# Altium footprint library Connectors.PcbLib: 97 footprints (part 4 of 7)
Each footprint in its own frame and in the unit in brackets; x right, y up, seen from the top. Pads: shape width x height; smd on the part's side, far side on the other; paste and mask are expansions set on the pad; w line width, h text height; cw(c..) or ccw(c..) is an arc to the next point about the centre after c.
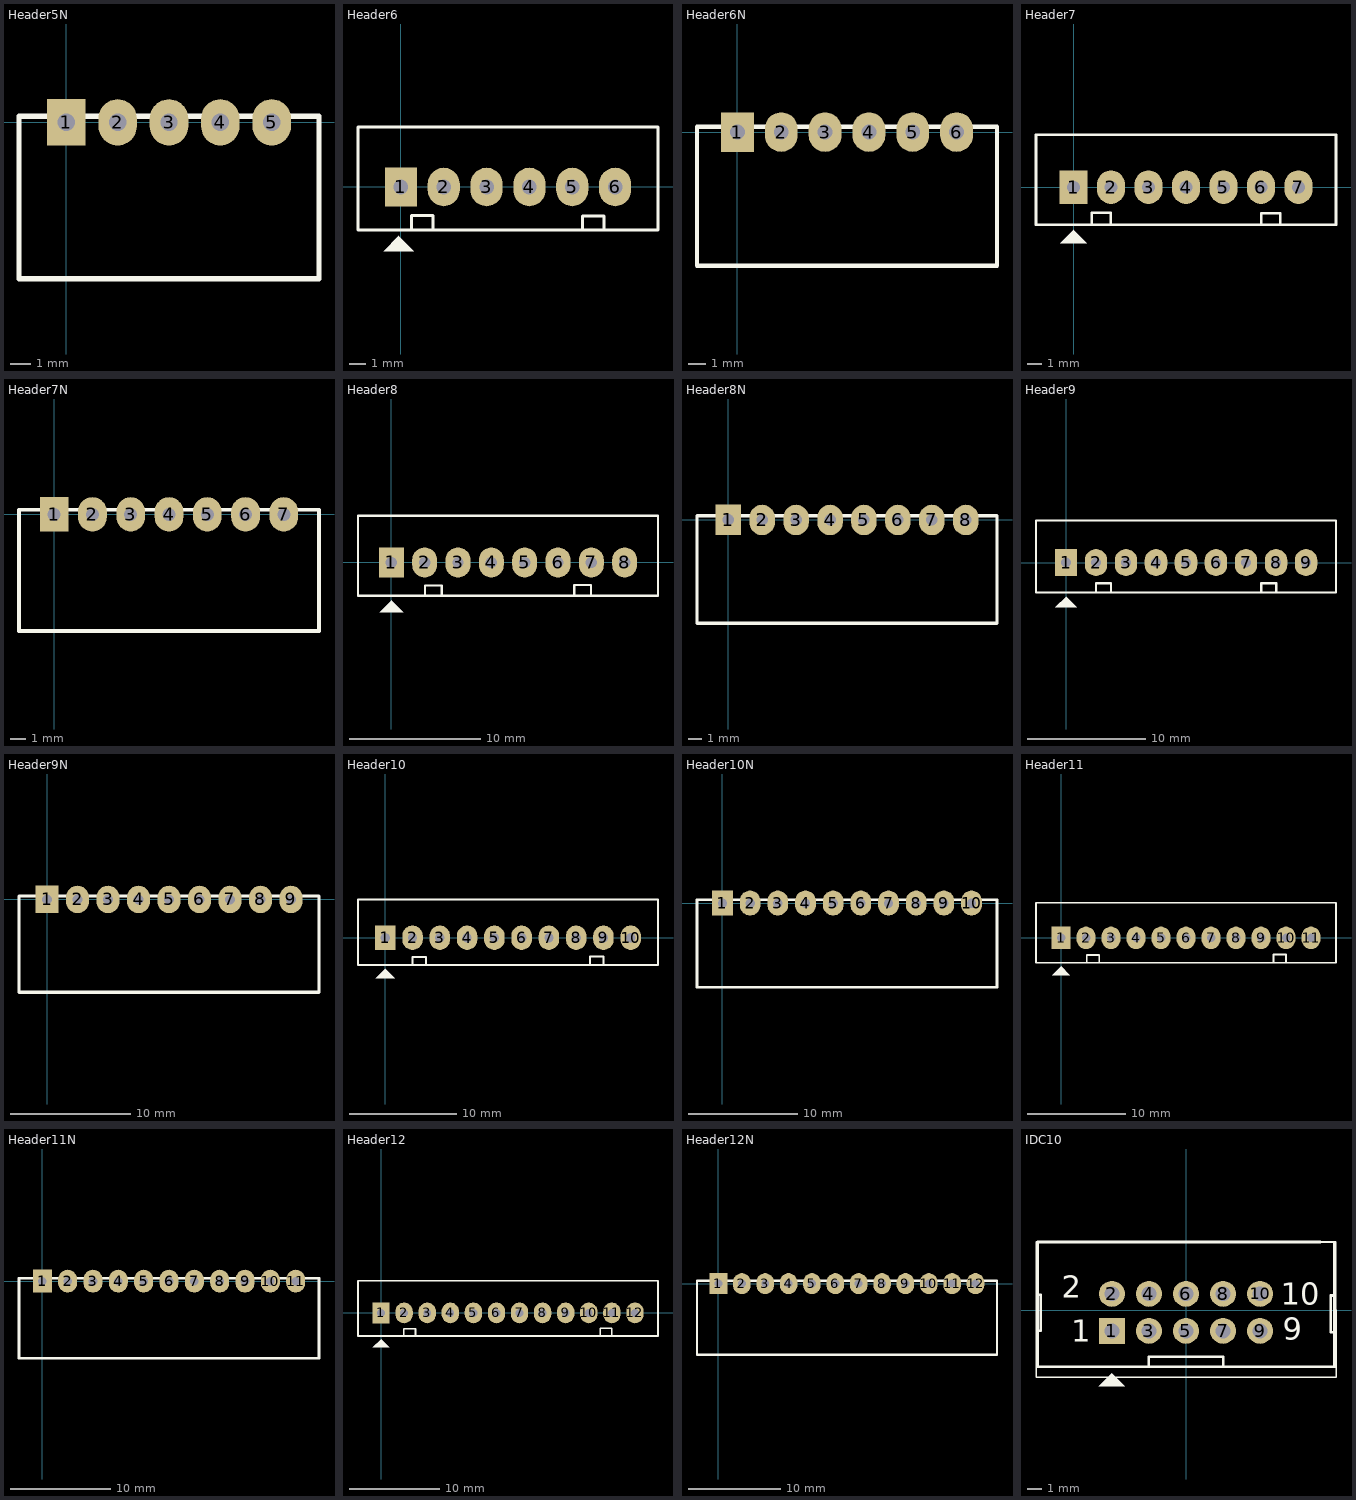
[diagram p3: the footprints below, top view; thin cyan lines are the x and y axes]

## Header5N [mil] "CON5"
height 200
pads (5):
  rect 75x90 hole 34: 1(0,0)
  oval 75x90 hole 34: 2(100,0) 3(200,0) 4(300,0) 5(400,0)
Top Overlay:
  lines w10: -92,-304.47 492,-304.47 492,11.92 -92,11.92 -92,-304.47
3D body "JST - XH - Thru R - 5Pin - 2.54mm.stp": height 230, standoff -133, extent -92,-304.47 492,11.92

## Header6 [mil] "CON6"
height 200
pads (6):
  rect 75x90 hole 34: 1(0,0)
  oval 75x90 hole 34: 2(100,0) 3(200,0) 4(300,0) 5(400,0) 6(500,0)
Top Overlay:
  region: -40.5,-149.5 30.5,-149.5 -4.5,-114.5 -4.5,-113.5
  lines w7: 25,-97 25,-67 75,-67 75,-97 ; 424,-98 424,-68 474,-68 474,-98 ; -100,-100 -100,140 600,140 600,0 600,-100 -100,-100
3D body "User Library-JST - XH - Thru (V) - 6Pin - 2_54mm (1).step": height 284, standoff -118, extent -92.39,-100.36 591.61,129.64

## Header6N [mil] "CON6"
height 200
pads (6):
  rect 75x90 hole 34: 1(0,0)
  oval 75x90 hole 34: 2(100,0) 3(200,0) 4(300,0) 5(400,0) 6(500,0)
Top Overlay:
  lines w10: -92,-304.47 592,-304.47 592,11.92 -92,11.92 -92,-304.47
3D body "JST - XH - Thru R - 6Pin - 2.54mm.stp": height 230, standoff -133, extent -92,-304.47 592,11.92

## Header7 [mil] "CON7"
height 200
pads (7):
  rect 75x90 hole 34: 1(0,0)
  oval 75x90 hole 34: 2(100,0) 3(200,0) 4(300,0) 5(400,0) 6(500,0) 7(600,0)
Top Overlay:
  region: -35.5,-149.5 35.5,-149.5 0.5,-114.5 0.5,-113.5
  lines w7: 49,-98 49,-68 99,-68 99,-98 ; 501,-99 501,-69 551,-69 551,-99 ; -100,-100 -100,140 700,140 700,0 700,-100 -100,-100
3D body "JST - XH - Thru V - 7Pin - 2.54mm.stp": height 284, standoff -118, extent -92,-98 692,132

## Header7N [mil] "CON7"
height 200
pads (7):
  rect 75x90 hole 34: 1(0,0)
  oval 75x90 hole 34: 2(100,0) 3(200,0) 4(300,0) 5(400,0) 6(500,0) 7(600,0)
Top Overlay:
  lines w10: -92,-304.47 692,-304.47 692,11.92 -92,11.92 -92,-304.47
3D body "JST - XH - Thru R - 7Pin - 2.54mm.stp": height 230, standoff -133, extent -92,-304.47 692,11.92

## Header8 [mil] "CON8"
height 200
pads (8):
  rect 75x90 hole 34: 1(0,0)
  oval 75x90 hole 34: 2(100,0) 3(200,0) 4(300,0) 5(400,0) 6(500,0) 7(600,0) 8(700,0)
Top Overlay:
  region: -35.5,-149.5 35.5,-149.5 0.5,-114.5 0.5,-113.5
  lines w7: 101,-99 101,-69 151,-69 151,-99 ; 549,-98 549,-68 599,-68 599,-98 ; -100,-100 800,-100 800,0 800,140 -100,140 -100,-100
3D body "JST - XH - Thru V - 8Pin - 2.54mm.stp": height 284, standoff -118, extent -92,-98 792,132

## Header8N [mil] "CON8"
height 200
pads (8):
  rect 75x90 hole 34: 1(0,0)
  oval 75x90 hole 34: 2(100,0) 3(200,0) 4(300,0) 5(400,0) 6(500,0) 7(600,0) 8(700,0)
Top Overlay:
  lines w10: -92,-304.47 792,-304.47 792,11.92 -92,11.92 -92,-304.47
3D body "JST - XH - Thru R - 8Pin - 2.54mm.stp": height 230, standoff -133, extent -92,-304.47 792,11.92

## Header9 [mil] "CON9"
height 200
pads (9):
  rect 75x90 hole 34: 1(0,0)
  oval 75x90 hole 34: 2(100,0) 3(200,0) 4(300,0) 5(400,0) 6(500,0) 7(600,0) 8(700,0) 9(800,0)
Top Overlay:
  region: -35.5,-149.5 35.5,-149.5 0.5,-114.5 0.5,-113.5
  lines w7: 100,-99 100,-69 150,-69 150,-99 ; 651,-99 651,-69 701,-69 701,-99 ; -100,-100 -100,140 900,140 900,0 900,-100 -100,-100
3D body "JST - XH - Thru V - 9Pin - 2.54mm.stp": height 284, standoff -118, extent -92,-98 892,132

## Header9N [mil] "CON9"
height 200
pads (9):
  rect 75x90 hole 34: 1(0,0)
  oval 75x90 hole 34: 2(100,0) 3(200,0) 4(300,0) 5(400,0) 6(500,0) 7(600,0) 8(700,0) 9(800,0)
Top Overlay:
  lines w10: -92,-304.47 892,-304.47 892,11.92 -92,11.92 -92,-304.47
3D body "JST - XH - Thru R - 9Pin - 2.54mm.stp": height 230, standoff -133, extent -92,-304.47 892,11.92

## Header10 [mil] "CON10"
height 200
pads (10):
  rect 75x90 hole 34: 1(0,0)
  oval 75x90 hole 34: 2(100,0) 3(200,0) 4(300,0) 5(400,0) 6(500,0) 7(600,0) 8(700,0) 9(800,0) 10(900,0)
Top Overlay:
  region: -35.5,-149.5 35.5,-149.5 0.5,-114.5 0.5,-113.5
  lines w7: 100,-100 100,-70 150,-70 150,-100 ; 750,-99 750,-69 800,-69 800,-99 ; -100,-100 -100,140 1000,140 1000,0 1000,-100 -100,-100
3D body "JST - XH - Thru V - 10Pin - 2.54mm.stp": height 284, standoff -118, extent -92,-98 992,132

## Header10N [mil] "CON10"
height 200
pads (10):
  rect 75x90 hole 34: 1(0,0)
  oval 75x90 hole 34: 2(100,0) 3(200,0) 4(300,0) 5(400,0) 6(500,0) 7(600,0) 8(700,0) 9(800,0) 10(900,0)
Top Overlay:
  lines w10: -92,-304.47 992,-304.47 992,11.92 -92,11.92 -92,-304.47
3D body "JST - XH - Thru R - 10Pin - 2.54mm.stp": height 230, standoff -133, extent -92,-304.47 992,11.92

## Header11 [mil] "CON11"
height 200
pads (11):
  rect 75x90 hole 34: 1(0,0)
  oval 75x90 hole 34: 2(100,0) 3(200,0) 4(300,0) 5(400,0) 6(500,0) 7(600,0) 8(700,0) 9(800,0) 10(900,0) 11(1000,0)
Top Overlay:
  region: -35.5,-149.5 35.5,-149.5 0.5,-114.5 0.5,-113.5
  lines w7: 103,-99 103,-69 153,-69 153,-99 ; 850,-97 850,-67 900,-67 900,-97 ; -100,-100 -100,140 1100,140 1100,0 1100,-100 -100,-100
3D body "JST - XH - Thru V - 11Pin - 2.54mm.stp": height 284, standoff -118, extent -92,-98 1092,132

## Header11N [mil] "CON11"
height 200
pads (11):
  rect 75x90 hole 34: 1(0,0)
  oval 75x90 hole 34: 2(100,0) 3(200,0) 4(300,0) 5(400,0) 6(500,0) 7(600,0) 8(700,0) 9(800,0) 10(900,0) 11(1000,0)
Top Overlay:
  lines w10: -92,-304.45 1092,-304.45 1092,11.15 -92,11.15 -92,-304.45
3D body "JST - XH - Thru R - 11Pin - 2.54mm.stp": height 230, standoff -133, extent -92,-304.47 1092,11.92

## Header12 [mil] "CON12"
height 200
pads (12):
  rect 75x90 hole 34: 1(0,0)
  oval 75x90 hole 34: 2(100,0) 3(200,0) 4(300,0) 5(400,0) 6(500,0) 7(600,0) 8(700,0) 9(800,0) 10(900,0) 11(1000,0) 12(1100,0)
Top Overlay:
  region: -35.5,-149.5 35.5,-149.5 0.5,-114.5 0.5,-113.5
  lines w7: 99,-99 99,-69 149,-69 149,-99 ; 950,-97 950,-67 1000,-67 1000,-97 ; -100,-100 -100,140 1200,140 1200,0 1200,-100 -100,-100
3D body "JST - XH - Thru V - 12Pin - 2.54mm.stp": height 284, standoff -118, extent -92,-98 1192,132

## Header12N [mil] "CON12"
height 200
pads (12):
  rect 75x90 hole 34: 1(0,0)
  oval 75x90 hole 34: 2(100,0) 3(200,0) 4(300,0) 5(400,0) 6(500,0) 7(600,0) 8(700,0) 9(800,0) 10(900,0) 11(1000,0) 12(1100,0)
Top Overlay:
  lines w10: -92,-304.47 1192,-304.47 1192,11.92 -92,11.92 -92,-304.47
3D body "JST - XH - Thru R - 12Pin - 2.54mm.stp": height 230, standoff -133, extent -92,-304.47 1192,11.92

## IDC10 [mil]
pads (10):
  rect 70x70 hole 40: 1(-200,-55)
  round 70 hole 40: 2(-200,45) 3(-100,-55) 4(-100,45) 5(0,-55) 6(0,45) 7(100,-55) 8(100,45) 9(200,-55) 10(200,45)
Top Overlay:
  region: -200,-170 -235,-205 -165,-205
  lines w4: -405,-180 -405,186 405,186 405,-180 -405,-180
  lines w5: 362.79,185 400,185 400,140 401,140
  lines w7: -400.79,-55.98 -399.8,-55 -391.93,-55 -391.93,42.44 -400.79,42.44 ; -100.59,-151 -100.59,-125 100.2,-125 100.2,-152 ; 398.56,-151.44 401,-149 ; 401,-59 391,-59 391,40.41 401,40.41 ; 402,-152.44 -400.79,-152.44 -400.79,185 ; -400.79,185 362.79,185 -400.79,185 ; 401,-149 401,146 401,-149
  text "10" at 256,16 h60
  text "9" at 261,-79 h60
  text "2" at -335,35 h60
  text "1" at -309.25,-84.53 h60
3D body "User Library-IDC-10M.STEP": height 366.14, standoff -122.05, extent -399.6,-178.23 399.61,180.04